# Altium footprint library PcbLib_ICs.PcbLib: 317 footprints (part 17 of 24)
Each footprint in its own frame and in the unit in brackets; x right, y up, seen from the top. Pads: shape width x height; smd on the part's side, far side on the other; paste and mask are expansions set on the pad; w line width, h text height; cw(c..) or ccw(c..) is an arc to the next point about the centre after c.
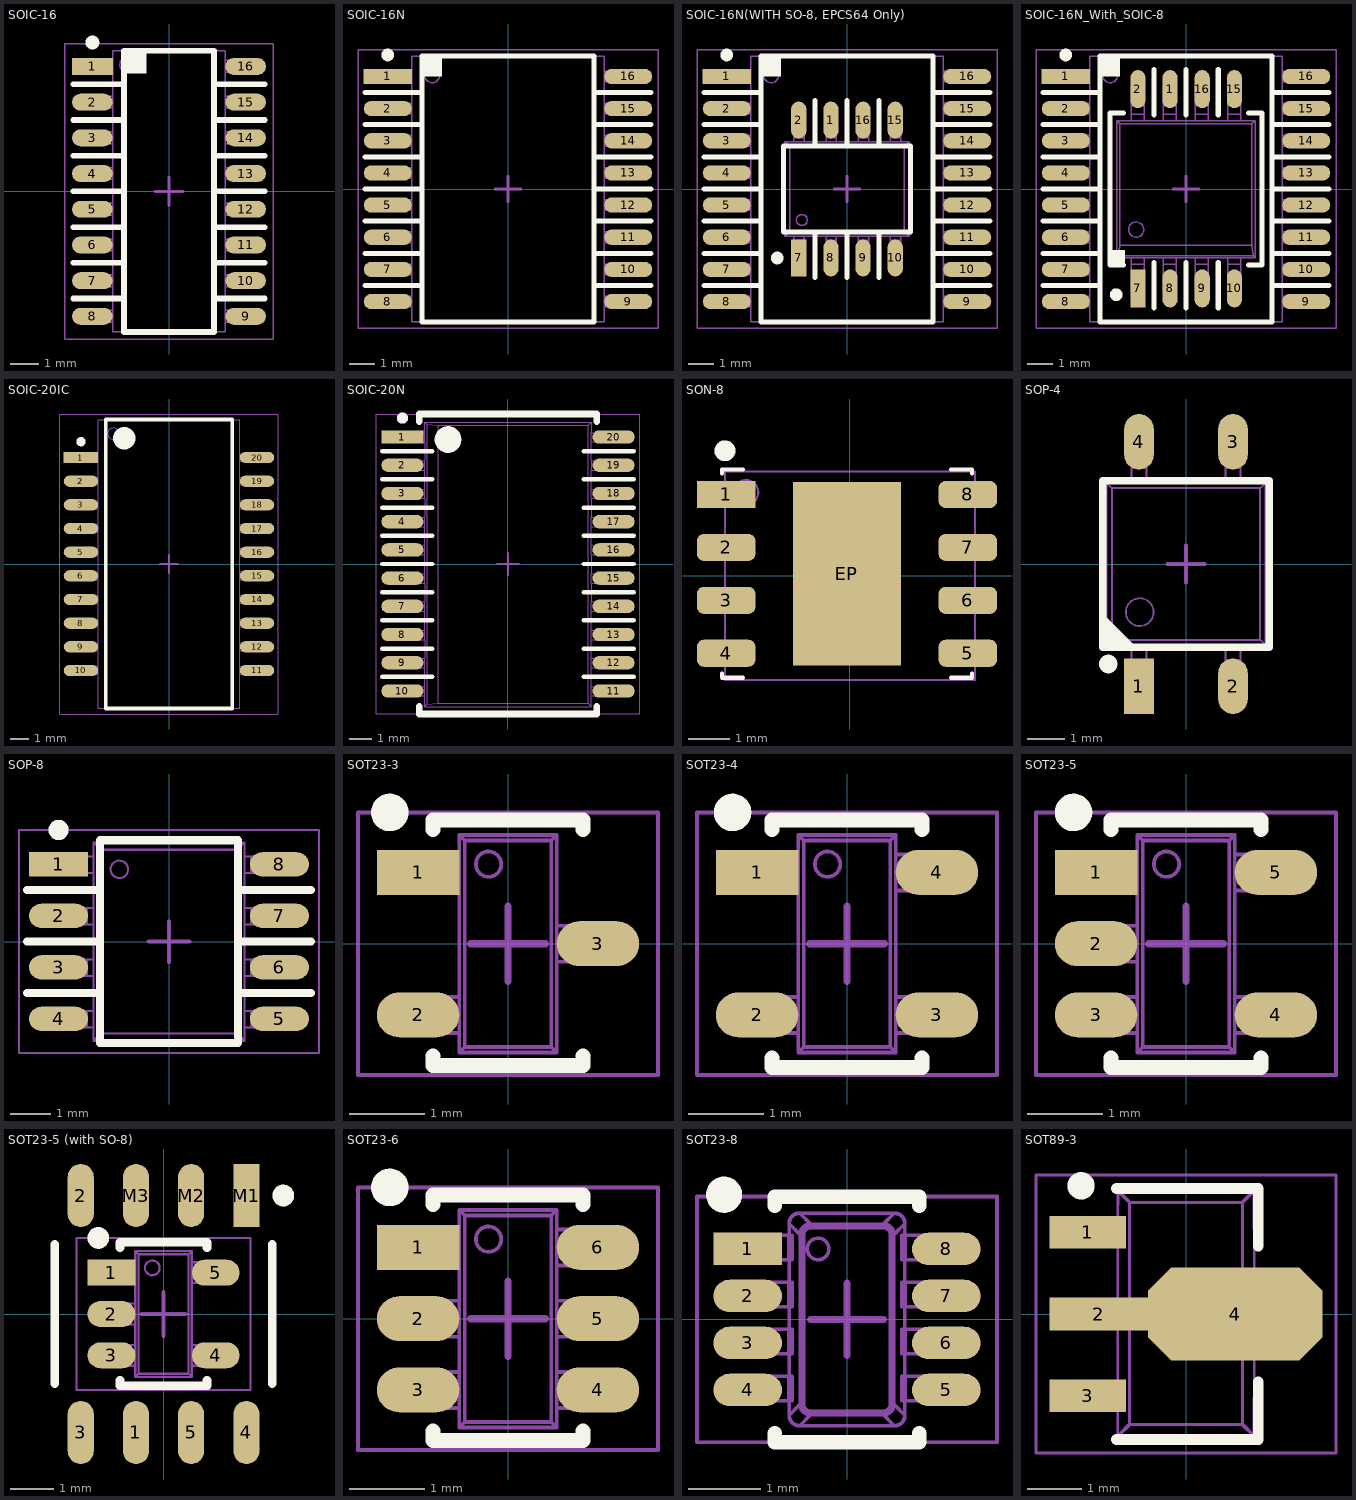
[diagram p16: the footprints below, top view; thin cyan lines are the x and y axes]

## SOIC-16 [mm] "package SOIC-16, 150 mil"
height 1.75
pads (16):
  rect 1.45x0.6 smd paste+0 mask+0.05: 1(-2.725,4.445)
  oval 1.45x0.6 smd paste+0 mask+0.05: 2(-2.725,3.175) 3(-2.725,1.905) 4(-2.725,0.635) 5(-2.725,-0.635) 6(-2.725,-1.905) 7(-2.725,-3.175) 8(-2.725,-4.445) 9(2.725,-4.445) 10(2.725,-3.175) 11(2.725,-1.905) 12(2.725,-0.635) 13(2.725,0.635) 14(2.725,1.905) 15(2.725,3.175) 16(2.725,4.445)
Top Overlay:
  circle w0.25: c-2.725,5.295 r0.125
  rectangle: -1.6,4.2 -0.8,5
  lines w0.2: -3.4,-3.81 -1.6,-3.81 ; -3.4,-2.54 -1.6,-2.54 ; -3.4,-1.27 -1.6,-1.27 ; -3.4,0 -1.6,0 ; -3.4,1.27 -1.6,1.27 ; -3.4,2.54 -1.6,2.54 ; -3.4,3.81 -1.6,3.81 ; 1.6,-3.81 3.4,-3.81 ; 1.6,-2.54 3.4,-2.54 ; 1.6,-1.27 3.4,-1.27 ; 1.6,0 3.4,0 ; 1.6,1.27 3.4,1.27 ; 1.6,2.54 3.4,2.54 ; 1.6,3.81 3.4,3.81 ; -1.6,-5 1.6,-5 1.6,5 -1.6,5 -1.6,-5
Top Assy:
  drawing of 213 lines, arcs and shapes, not listed
  text ".Designator" at 0.467,-3.443 h2
Top Text:
  lines w0.05: -3.7,-5.25 3.7,-5.25 3.7,5.25 -3.7,5.25 -3.7,-5.25
  lines w0.1: -0.5,0 0.5,0 ; 0,-0.5 0,0.5
3D body "SOIC-16.step": height 1.75, standoff 0, extent -3,-5 3,5

## SOIC-16N [mm] "SOIC16 300mil, 16-Leads, Body 10.29x7.49mm, Pitch 1.27mm, IPC Medium Density"
height 2.64
pads (16):
  rect 1.9x0.6 smd paste+0 mask+0.05: 1(-4.75,4.445)
  oval 1.9x0.6 smd paste+0 mask+0.05: 2(-4.75,3.175) 3(-4.75,1.905) 4(-4.75,0.635) 5(-4.75,-0.635) 6(-4.75,-1.905) 7(-4.75,-3.175) 8(-4.75,-4.445) 9(4.75,-4.445) 10(4.75,-3.175) 11(4.75,-1.905) 12(4.75,-0.635) 13(4.75,0.635) 14(4.75,1.905) 15(4.75,3.175) 16(4.75,4.445)
Top Overlay:
  circle w0.25: c-4.75,5.295 r0.125
  rectangle: -3.4,4.45 -2.6,5.25
  lines w0.2: -5.65,-3.81 -3.4,-3.81 ; -5.65,-2.54 -3.4,-2.54 ; -5.65,-1.27 -3.4,-1.27 ; -5.65,0 -3.4,0 ; -5.65,1.27 -3.4,1.27 ; -5.65,2.54 -3.4,2.54 ; -5.65,3.81 -3.4,3.81 ; 3.4,-3.81 5.65,-3.81 ; 3.4,-2.54 5.65,-2.54 ; 3.4,-1.27 5.65,-1.27 ; 3.4,0 5.65,0 ; 3.4,1.27 5.65,1.27 ; 3.4,2.54 5.65,2.54 ; 3.4,3.81 5.65,3.81 ; -3.4,-5.25 -3.4,5.25 3.4,5.25 3.4,-5.25 -3.4,-5.25
Top Assy:
  drawing of 213 lines, arcs and shapes, not listed
  text ".Designator" at 0.467,-3.443 h2
Top Text:
  lines w0.05: -5.925,-5.5 -5.925,5.5 5.925,5.5 5.925,-5.5 -5.925,-5.5
  lines w0.1: -0.5,0 0.5,0 ; 0,-0.5 0,0.5
3D body "SOIC-16N.step": height 2.64, standoff 0, extent -5.162,-5.25 5.163,5.25

## SOIC-16N(WITH SO-8, EPCS64 Only) [mm] "SOIC16 300mil, 16-Leads, Body 10.29x7.49mm, Pitch 1.27mm, IPC Medium Density"
height 2.64
pads (24):
  rect 1.9x0.6 smd paste+0 mask+0.05: 1(-4.75,4.445)
  oval 0.6x1.45 smd paste+0 mask+0.05: 1(-0.635,2.725) 2(-1.905,2.725) 8(-0.635,-2.725) 9(0.635,-2.725) 10(1.905,-2.725) 15(1.905,2.725) 16(0.635,2.725)
  oval 1.9x0.6 smd paste+0 mask+0.05: 2(-4.75,3.175) 3(-4.75,1.905) 4(-4.75,0.635) 5(-4.75,-0.635) 6(-4.75,-1.905) 7(-4.75,-3.175) 8(-4.75,-4.445) 9(4.75,-4.445) 10(4.75,-3.175) 11(4.75,-1.905) 12(4.75,-0.635) 13(4.75,0.635) 14(4.75,1.905) 15(4.75,3.175) 16(4.75,4.445)
  rect 0.6x1.45 smd paste+0 mask+0.05: 7(-1.905,-2.725)
Top Overlay:
  circle w0.25: c-4.75,5.295 r0.125
  circle w0.25: c-2.755,-2.725 r0.125
  rectangle: -3.4,4.45 -2.6,5.25
  lines w0.2: -5.65,-3.81 -3.4,-3.81 ; -5.65,-2.54 -3.4,-2.54 ; -5.65,-1.27 -3.4,-1.27 ; -5.65,0 -3.4,0 ; -5.65,1.27 -3.4,1.27 ; -5.65,2.54 -3.4,2.54 ; -5.65,3.81 -3.4,3.81 ; -1.27,-3.5 -1.27,-1.7 ; -1.27,1.7 -1.27,3.5 ; 0,-3.5 0,-1.7 ; 0,1.7 0,3.5 ; 1.27,-3.5 1.27,-1.7 ; 1.27,1.7 1.27,3.5 ; 3.4,-3.81 5.65,-3.81 ; 3.4,-2.54 5.65,-2.54 ; 3.4,-1.27 5.65,-1.27 ; 3.4,0 5.65,0 ; 3.4,1.27 5.65,1.27 ; 3.4,2.54 5.65,2.54 ; 3.4,3.81 5.65,3.81 ; -3.4,-5.25 3.4,-5.25 3.4,5.25 -3.4,5.25 -3.4,-5.25 ; -2.5,-1.7 -2.5,1.7 2.5,1.7 2.5,-1.7 -2.5,-1.7
Top Assy:
  drawing of 358 lines, arcs and shapes, not listed
  text ".Designator" at 0.467,-3.443 h2
Top Text:
  lines w0.05: -5.925,-5.5 5.925,-5.5 5.925,5.5 -5.925,5.5 -5.925,-5.5
  lines w0.1: -0.5,0 0.5,0 ; 0,-0.5 0,0.5
3D body "SOIC-16N.step": height 2.64, standoff 0, extent -5.162,-5.25 5.163,5.25

## SOIC-16N_With_SOIC-8 [mm] "SOIC16 300mil, 16-Leads, Body 10.29x7.49mm, Pitch 1.27mm, IPC Medium Density"
height 2.64
pads (24):
  rect 1.9x0.6 smd paste+0 mask+0.05: 1(-4.75,4.445)
  oval 0.6x1.5 smd paste+0 mask+0.05: 1(-0.63,3.943) 2(-1.9,3.943) 8(-0.63,-3.925) 9(0.64,-3.925) 10(1.91,-3.925) 15(1.91,3.943) 16(0.64,3.943)
  oval 1.9x0.6 smd paste+0 mask+0.05: 2(-4.75,3.175) 3(-4.75,1.905) 4(-4.75,0.635) 5(-4.75,-0.635) 6(-4.75,-1.905) 7(-4.75,-3.175) 8(-4.75,-4.445) 9(4.75,-4.445) 10(4.75,-3.175) 11(4.75,-1.905) 12(4.75,-0.635) 13(4.75,0.635) 14(4.75,1.905) 15(4.75,3.175) 16(4.75,4.445)
  rect 0.6x1.5 smd paste+0 mask+0.05: 7(-1.9,-3.925)
Top Overlay:
  circle w0.25: c-4.75,5.295 r0.125
  circle w0.25: c-2.755,-4.175 r0.125
  rectangle: -3.4,4.45 -2.6,5.25
  region: -2.4,-3 -2.4,-2.4 -3,-2.4 -3,-3
  lines w0.2: -5.65,-3.81 -3.4,-3.81 ; -5.65,-2.54 -3.4,-2.54 ; -5.65,-1.27 -3.4,-1.27 ; -5.65,0 -3.4,0 ; -5.65,1.27 -3.4,1.27 ; -5.65,2.54 -3.4,2.54 ; -5.65,3.81 -3.4,3.81 ; -2.475,-3 -3,-3 -3,3 -2.475,3 ; -1.265,-4.7 -1.265,-2.9 ; -1.265,2.918 -1.265,4.718 ; 0.005,-4.7 0.005,-2.9 ; 0.005,2.918 0.005,4.718 ; 1.275,-4.7 1.275,-2.9 ; 1.275,2.918 1.275,4.718 ; 2.475,-3 3,-3 3,3 2.475,3 ; 3.4,-3.81 5.65,-3.81 ; 3.4,-2.54 5.65,-2.54 ; 3.4,-1.27 5.65,-1.27 ; 3.4,0 5.65,0 ; 3.4,1.27 5.65,1.27 ; 3.4,2.54 5.65,2.54 ; 3.4,3.81 5.65,3.81 ; -3.4,-5.25 3.4,-5.25 3.4,5.25 -3.4,5.25 -3.4,-5.25
Top Assy:
  drawing of 365 lines, arcs and shapes, not listed
  text ".Designator" at 0.467,-3.443 h2
Top Text:
  lines w0.05: -5.925,-5.5 5.925,-5.5 5.925,5.5 -5.925,5.5 -5.925,-5.5
  lines w0.1: -0.5,0 0.5,0 -0.5,0 ; 0,-0.5 0,0.5 0,-0.5
3D body "SOIC-16N.step": height 2.64, standoff 0, extent -5.162,-5.25 5.163,5.25

## SOIC-20IC [mm] "SOIC, 20-Leads, Body 15,40x7,49mm, Pitch 1,27mm, IPC Medium Density"
height 2.64
pads (20):
  rect 1.85x0.6 smd paste+0 mask+0.05: 1(-4.725,5.715)
  oval 1.85x0.6 smd paste+0 mask+0.05: 2(-4.725,4.445) 3(-4.725,3.175) 4(-4.725,1.905) 5(-4.725,0.635) 6(-4.725,-0.635) 7(-4.725,-1.905) 8(-4.725,-3.175) 9(-4.725,-4.445) 10(-4.725,-5.715) 11(4.725,-5.715) 12(4.725,-4.445) 13(4.725,-3.175) 14(4.725,-1.905) 15(4.725,-0.635) 16(4.725,0.635) 17(4.725,1.905) 18(4.725,3.175) 19(4.725,4.445) 20(4.725,5.715)
Top Overlay:
  circle w0.6: c-2.4,6.75 r0.3
  circle w0.25: c-4.725,6.565 r0.125
  lines w0.2: -3.4,-7.75 3.4,-7.75 3.4,7.75 -3.4,7.75 -3.4,-7.75
Top Assy:
  drawing of 265 lines, arcs and shapes, not listed
  text ".Designator" at -3.443,-0.467 h2
Top Text:
  lines w0.05: -5.875,-8.05 5.875,-8.05 5.875,8.05 -5.875,8.05 -5.875,-8.05
  lines w0.1: -0.5,0 0.5,0 ; 0,-0.5 0,0.5
3D body "SOIC-20IC.step": height 2.64, standoff 0, extent -5.15,-7.75 5.15,7.75

## SOIC-20N [mm] "SOIC, 20-Leads, Body 12.80x7.50mm, Pitch 1.27mm, IPC Medium Density"
height 2.65
pads (20):
  rect 1.9x0.6 smd paste+0 mask+0.05: 1(-4.75,5.715)
  oval 1.9x0.6 smd paste+0 mask+0.05: 2(-4.75,4.445) 3(-4.75,3.175) 4(-4.75,1.905) 5(-4.75,0.635) 6(-4.75,-0.635) 7(-4.75,-1.905) 8(-4.75,-3.175) 9(-4.75,-4.445) 10(-4.75,-5.715) 11(4.75,-5.715) 12(4.75,-4.445) 13(4.75,-3.175) 14(4.75,-1.905) 15(4.75,-0.635) 16(4.75,0.635) 17(4.75,1.905) 18(4.75,3.175) 19(4.75,4.445) 20(4.75,5.715)
Top Overlay:
  circle w0.25: c-4.75,6.565 r0.125
  circle w0.6: c-2.7,5.6 r0.3
  lines w0.2: -5.65,-5.08 -3.4,-5.08 ; -5.65,-3.81 -3.4,-3.81 ; -5.65,-2.54 -3.4,-2.54 ; -5.65,-1.27 -3.4,-1.27 ; -5.65,0 -3.4,0 ; -5.65,1.27 -3.4,1.27 ; -5.65,2.54 -3.4,2.54 ; -5.65,3.81 -3.4,3.81 ; -5.65,5.08 -3.4,5.08 ; 3.4,-5.08 5.65,-5.08 ; 3.4,-3.81 5.65,-3.81 ; 3.4,-2.54 5.65,-2.54 ; 3.4,-1.27 5.65,-1.27 ; 3.4,0 5.65,0 ; 3.4,1.27 5.65,1.27 ; 3.4,2.54 5.65,2.54 ; 3.4,3.81 5.65,3.81 ; 3.4,5.08 5.65,5.08
  lines w0.3: -4,-6.4 -4,-6.75 4,-6.75 4,-6.4 ; -4,6.4 -4,6.75 4,6.75 4,6.4
Top Assy:
  drawing of 296 lines, arcs and shapes, not listed
  text ".Designator" at -3.443,-0.467 h2
Top Text:
  lines w0.05: -5.925,-6.75 -5.925,6.75 5.925,6.75 5.925,-6.75 -5.925,-6.75
  lines w0.1: -0.5,0 0.5,0 ; 0,-0.5 0,0.5
3D body "SOIC127P1030X265-20N.step": height 2.65, standoff 0, extent -5.162,-6.5 5.163,6.5

## SON-8 [mm] "SON-8, 8-Leads, Body 6,00x5,00mm, Pitch 1,27mm, Thermal Pad 4,1x2,4mm"
height 0.8
pads (9):
  rect 1.4x0.65 smd paste+0 mask+0.05: 1(-2.971,1.951)
  rrect50% 1.4x0.65 smd paste+0 mask+0.05: 2(-2.971,0.681) 3(-2.971,-0.589) 4(-2.971,-1.859) 5(2.829,-1.859) 6(2.829,-0.589) 7(2.829,0.681) 8(2.829,1.951)
  rect 2.6x4.4 smd paste-50 mask+0.05: EP(-0.071,0.051)
Top Overlay:
  circle w0.25: c-3,3 r0.125
  lines w0.1: -3.071,-2.349 -3.071,-2.449 -2.571,-2.449 ; -3.071,2.451 -3.071,2.551 -2.571,2.551 ; 2.429,-2.449 2.929,-2.449 2.929,-2.349 ; 2.429,2.551 2.929,2.551 2.929,2.451
Top Paste:
  rectangle: -1.371,1.751 -0.871,2.251
  rectangle: -1.371,1.151 -0.871,1.651
  rectangle: -1.371,0.551 -0.871,1.051
  rectangle: -1.371,-0.249 -0.871,0.451
  rectangle: -0.771,-0.249 -0.171,0.451
  rectangle: -0.771,0.551 -0.171,1.051
  rectangle: -0.771,1.151 -0.171,1.651
  rectangle: -0.771,1.751 -0.171,2.251
  rectangle: -0.071,-0.249 0.529,0.451
  rectangle: -0.071,0.551 0.529,1.051
  rectangle: -0.071,1.151 0.529,1.651
  rectangle: -0.071,1.751 0.529,2.251
  rectangle: 0.629,-0.249 1.229,0.451
  rectangle: 0.629,0.551 1.229,1.051
  rectangle: 0.629,1.151 1.229,1.651
  rectangle: 0.629,1.751 1.229,2.251
  rectangle: -1.371,-0.949 -0.871,-0.349
  rectangle: -1.371,-1.549 -0.871,-1.049
  rectangle: -1.371,-2.149 -0.871,-1.649
  rectangle: -0.771,-2.149 -0.171,-1.649
  rectangle: -0.771,-1.549 -0.171,-1.049
  rectangle: -0.771,-0.949 -0.171,-0.349
  rectangle: -0.071,-2.149 0.529,-1.649
  rectangle: -0.071,-1.549 0.529,-1.049
  rectangle: -0.071,-0.949 0.529,-0.349
  rectangle: 0.629,-2.149 1.229,-1.649
  rectangle: 0.629,-1.549 1.229,-1.049
  rectangle: 0.629,-0.949 1.229,-0.349
Top Solder:
  region: 1.329,2.351 -1.471,2.351 -1.471,-2.249 1.329,-2.249
Top Assy:
  circle w0.05: c-2.5,2 r0.3
  lines w0.05: -3,-2.13 -3.07,-2.13 -3.07,-1.59 -3,-1.59 ; -3,-0.86 -3.07,-0.86 -3.07,-0.32 -3,-0.32 ; -3,0.41 -3.07,0.41 -3.07,0.95 -3,0.95 ; -3,1.68 -3.07,1.68 -3.07,2.22 -3,2.22 ; 3,-2.13 3.07,-2.13 3.07,-1.59 3,-1.59 ; 3,-0.86 3.07,-0.86 3.07,-0.32 3,-0.32 ; 3,0.41 3.07,0.41 3.07,0.95 3,0.95 ; 3,1.68 3.07,1.68 3.07,2.22 3,2.22 ; -3,-2.5 0,-2.5 3,-2.5 3,2.5 0,2.5 -3,2.5 -3,-2.5
  text ".Designator" at 0.349,-2.579 h1.5
Top Text:
  lines w0.1: -0.5,0 0.5,0 ; 0,-0.5 0,0.5
3D body "User Library-TDFN-8.step": height 0.83, standoff 0, extent -3.571,-2.449 3.429,2.551

## SOP-4 [mm] "4-SOP (0.173\"\", 4.40mm)"
pads (4):
  rect 0.8x1.5 smd paste+0 mask+0.05: 1(-1.27,-3.3)
  oval 0.8x1.5 smd paste+0 mask+0.05: 2(1.27,-3.3) 3(1.27,3.3) 4(-1.27,3.3)
Top Overlay:
  circle w0.25: c-2.1,-2.7 r0.125
  region: -2.25,-2.25 -2.25,-1.35 -1.35,-2.25
  lines w0.2: -2.25,-2.25 2.25,-2.25 2.25,2.25 -2.25,2.25 -2.25,-2.25
Top Assy:
  circle w0.05: c-1.25,-1.3 r0.375
  lines w0.05: -2.15,-2.2 2.15,-2.2 ; -2.15,-2.2 -2.15,2.2 ; -2.15,-2.2 -2,-2.05 ; -2.15,2.2 2.15,2.2 ; -2.15,2.2 -2,2.05 ; -2,-2.05 2,-2.05 ; -2,-2.05 -2,2.05 ; -2,2.05 2,2.05 ; -1.47,-3.05 -1.07,-3.05 ; -1.47,-3.05 -1.47,-3.4 -1.07,-3.4 -1.07,-3.05 ; -1.47,-3.05 -1.47,-2.9 ; -1.47,-2.9 -1.47,-2.6 ; -1.47,-2.9 -1.07,-2.9 ; -1.47,-2.6 -1.07,-2.6 ; -1.47,-2.6 -1.47,-2.2 -1.07,-2.2 -1.07,-2.6 ; -1.47,2.6 -1.07,2.6 ; -1.47,2.6 -1.47,2.9 ; -1.47,2.6 -1.47,2.2 -1.07,2.2 -1.07,2.6 ; -1.47,2.9 -1.47,3.05 ; -1.47,2.9 -1.07,2.9 ; -1.47,3.05 -1.07,3.05 ; -1.47,3.05 -1.47,3.4 -1.07,3.4 -1.07,3.05 ; -1.07,-3.05 -1.07,-2.9 ; -1.07,-2.9 -1.07,-2.6 ; -1.07,2.6 -1.07,2.9 ; -1.07,2.9 -1.07,3.05 ; 1.07,-3.05 1.47,-3.05 ; 1.07,-3.05 1.07,-3.4 1.47,-3.4 1.47,-3.05 ; 1.07,-3.05 1.07,-2.9 ; 1.07,-2.9 1.07,-2.6 ; 1.07,-2.9 1.47,-2.9 ; 1.07,-2.6 1.47,-2.6 ; 1.07,-2.6 1.07,-2.2 1.47,-2.2 1.47,-2.6 ; 1.07,2.6 1.47,2.6 ; 1.07,2.6 1.07,2.9 ; 1.07,2.6 1.07,2.2 1.47,2.2 1.47,2.6 ; 1.07,2.9 1.07,3.05 ; 1.07,2.9 1.47,2.9 ; 1.07,3.05 1.47,3.05 ; 1.07,3.05 1.07,3.4 1.47,3.4 1.47,3.05 ; 1.47,-3.05 1.47,-2.9 ; 1.47,-2.9 1.47,-2.6 ; 1.47,2.6 1.47,2.9 ; 1.47,2.9 1.47,3.05 ; 2,-2.05 2.15,-2.2 ; 2,-2.05 2,2.05 ; 2,2.05 2.15,2.2 ; 2.15,-2.2 2.15,2.2
  text ".Designator" at -2.579,-0.349 h1.5
Top Text:
  lines w0.1: -0.5,0 0.5,0 ; 0,-0.5 0,0.5
3D body "User Library-4-SOP.STEP": height 2.1, standoff 0, extent -2.15,-3.4 2.15,3.4

## SOP-8 [mm] "SOP-8"
height 1.75
pads (8):
  rect 1.45x0.6 smd paste+0 mask+0.05: 1(-2.725,1.905)
  oval 1.45x0.6 smd paste+0 mask+0.05: 2(-2.725,0.635) 3(-2.725,-0.635) 4(-2.725,-1.905) 5(2.725,-1.905) 6(2.725,-0.635) 7(2.725,0.635) 8(2.725,1.905)
Top Overlay:
  circle w0.25: c-2.725,2.755 r0.125
  lines w0.2: -3.5,-1.27 -1.7,-1.27 ; -3.5,0 -1.7,0 ; -3.5,1.27 -1.7,1.27 ; 1.7,-1.27 3.5,-1.27 ; 1.7,0 3.5,0 ; 1.7,1.27 3.5,1.27 ; -1.7,-2.5 -1.7,2.5 1.7,2.5 1.7,-2.5 -1.7,-2.5
Top Assy:
  circle w0.05: c-1.225,1.784 r0.216
  lines w0.05: -2.889,-2.121 -2.502,-2.121 ; -2.889,-2.121 -2.889,-1.715 ; -2.889,-2.121 -2.889,-1.715 ; -2.889,-2.121 -1.867,-2.121 ; -2.889,-1.715 -2.502,-1.715 ; -2.889,-1.715 -1.867,-1.715 ; -2.889,-0.851 -2.502,-0.851 ; -2.889,-0.851 -2.889,-0.445 ; -2.889,-0.851 -2.889,-0.445 ; -2.889,-0.851 -1.867,-0.851 ; -2.889,-0.445 -2.502,-0.445 ; -2.889,-0.445 -1.867,-0.445 ; -2.889,0.419 -2.502,0.419 ; -2.889,0.419 -2.889,0.826 ; -2.889,0.419 -2.889,0.826 ; -2.889,0.419 -1.867,0.419 ; -2.889,0.826 -2.502,0.825 ; -2.889,0.826 -1.867,0.825 ; -2.889,1.689 -2.502,1.689 ; -2.889,1.689 -2.889,2.095 ; -2.889,1.689 -2.889,2.095 ; -2.889,1.689 -1.867,1.689 ; -2.889,2.095 -2.502,2.095 ; -2.889,2.095 -1.867,2.095 ; -2.502,-2.121 -2.502,-1.715 ; -2.502,-2.121 -2.261,-2.121 ; -2.502,-1.715 -2.261,-1.715 ; -2.502,-0.851 -2.502,-0.445 ; -2.502,-0.851 -2.261,-0.851 ; -2.502,-0.445 -2.261,-0.445 ; -2.502,0.419 -2.502,0.825 ; -2.502,0.419 -2.261,0.419 ; -2.502,0.825 -2.261,0.826 ; -2.502,1.689 -2.502,2.095 ; -2.502,1.689 -2.261,1.689 ; -2.502,2.095 -2.261,2.095 ; -2.261,-2.121 -2.261,-1.715 ; -2.261,-2.121 -2.019,-2.121 ; -2.261,-1.715 -2.019,-1.715 ; -2.261,-0.851 -2.261,-0.445 ; -2.261,-0.851 -2.019,-0.851 ; -2.261,-0.445 -2.019,-0.445 ; -2.261,0.419 -2.261,0.826 ; -2.261,0.419 -2.019,0.419 ; -2.261,0.826 -2.019,0.825 ; -2.261,1.689 -2.261,2.095 ; -2.261,1.689 -2.019,1.689 ; -2.261,2.095 -2.019,2.095 ; -2.019,-2.121 -2.019,-1.715 ; -2.019,-2.121 -1.867,-2.121 ; -2.019,-1.715 -1.867,-1.715 ; -2.019,-0.851 -2.019,-0.445 ; -2.019,-0.851 -1.867,-0.851 ; -2.019,-0.445 -1.867,-0.445 ; -2.019,0.419 -2.019,0.825 ; -2.019,0.419 -1.867,0.419 ; -2.019,0.825 -1.867,0.825 ; -2.019,1.689 -2.019,2.095 ; -2.019,1.689 -1.867,1.689 ; -2.019,2.095 -1.867,2.095 ; -1.867,-2.451 1.867,-2.451 ; -1.867,-2.451 -1.682,-2.266 ; -1.867,-2.451 -1.867,2.451 ; -1.867,-2.451 -1.867,-2.121 ; -1.867,-2.451 1.867,-2.451 ; -1.867,-1.715 -1.867,-0.851 ; -1.867,-0.445 -1.867,0.419 ; -1.867,0.825 -1.867,1.689 ; -1.867,2.095 -1.867,2.451 ; -1.867,2.451 1.867,2.451 ; -1.867,2.451 -1.682,2.266 ; -1.867,2.451 1.867,2.451 ; -1.682,-2.266 1.682,-2.266 ; -1.682,-2.266 -1.682,2.266 ; -1.682,2.266 1.682,2.266 ; 1.682,-2.266 1.867,-2.451 ; 1.682,-2.266 1.682,2.266 ; 1.682,2.266 1.867,2.451 ; 1.867,-2.451 1.867,2.451 ; 1.867,-2.451 1.867,-2.121 ; 1.867,-2.121 2.019,-2.121 ; 1.867,-2.121 2.889,-2.121 ; 1.867,-1.715 2.019,-1.715 ; 1.867,-1.715 2.889,-1.715 ; 1.867,-1.715 1.867,-0.851 ; 1.867,-0.851 2.019,-0.851 ; 1.867,-0.851 2.889,-0.851 ; 1.867,-0.445 2.019,-0.445 ; 1.867,-0.445 2.889,-0.445 ; 1.867,-0.445 1.867,0.419 ; 1.867,0.419 2.019,0.419 ; 1.867,0.419 2.889,0.419 ; 1.867,0.825 2.019,0.826 ; 1.867,0.825 2.889,0.825 ; 1.867,0.825 1.867,1.689 ; 1.867,1.689 2.019,1.689 ; 1.867,1.689 2.889,1.689 ; 1.867,2.095 2.019,2.095 ; 1.867,2.095 2.889,2.095 ; 1.867,2.095 1.867,2.451 ; 2.019,-2.121 2.019,-1.715 ; 2.019,-2.121 2.261,-2.121 ; 2.019,-1.715 2.261,-1.715 ; 2.019,-0.851 2.019,-0.445 ; 2.019,-0.851 2.261,-0.851 ; 2.019,-0.445 2.261,-0.445 ; 2.019,0.419 2.019,0.826 ; 2.019,0.419 2.261,0.419 ; 2.019,0.826 2.261,0.826 ; 2.019,1.689 2.019,2.095 ; 2.019,1.689 2.261,1.689 ; 2.019,2.095 2.261,2.095 ; 2.261,-2.121 2.502,-2.121 ; 2.261,-2.121 2.261,-1.715 ; 2.261,-1.715 2.502,-1.715 ; 2.261,-0.851 2.502,-0.851 ; 2.261,-0.851 2.261,-0.445 ; 2.261,-0.445 2.502,-0.445 ; 2.261,0.419 2.502,0.419 ; 2.261,0.419 2.261,0.826 ; 2.261,0.826 2.502,0.825 ; 2.261,1.689 2.502,1.689 ; 2.261,1.689 2.261,2.095 ; 2.261,2.095 2.502,2.095 ; 2.502,-2.121 2.502,-1.715 ; 2.502,-2.121 2.889,-2.121 ; 2.502,-1.715 2.889,-1.715 ; 2.502,-0.851 2.502,-0.445 ; 2.502,-0.851 2.889,-0.851 ; 2.502,-0.445 2.889,-0.445 ; 2.502,0.419 2.502,0.825 ; 2.502,0.419 2.889,0.419 ; 2.502,0.825 2.889,0.825 ; 2.502,1.689 2.502,2.095 ; 2.502,1.689 2.889,1.689 ; 2.502,2.095 2.889,2.095 ; 2.889,-2.121 2.889,-1.715 ; 2.889,-2.121 2.889,-1.715 ; 2.889,-0.851 2.889,-0.445 ; 2.889,-0.851 2.889,-0.445 ; 2.889,0.419 2.889,0.825 ; 2.889,0.419 2.889,0.825 ; 2.889,1.689 2.889,2.095 ; 2.889,1.689 2.889,2.095
  text ".Designator" at 0.467,-3.443 h2
Top Text:
  lines w0.05: -3.7,-2.75 3.7,-2.75 3.7,2.75 -3.7,2.75 -3.7,-2.75
  lines w0.1: -0.5,0 0.5,0 ; 0,-0.5 0,0.5
3D body "User Library-SOIC-8-1.step": height 1.75, standoff 0, extent -3,-2.45 3,2.45

## SOT23-3 [mm] "SOT23, 6-Leads, Body 2.90x2.80mm, Pitch 0.95mm, IPC Medium Density"
height 1.45
pads (3):
  rect 1.1x0.6 smd paste+0 mask+0.05: 1(-1.2,0.95)
  oval 1.1x0.6 smd paste+0 mask+0.05: 2(-1.2,-0.95) 3(1.2,0)
Top Overlay:
  circle w0.25: c-1.575,1.75 r0.125
  lines w0.2: -1,-1.5 -1,-1.625 1,-1.625 1,-1.5 ; -1,1.525 -1,1.65 1,1.65 1,1.525
Top Assy:
  circle w0.05: c-0.26,1.06 r0.169
  lines w0.05: -1.19,-1.19 -1.099,-1.19 ; -1.19,-1.19 -1.4,-1.19 -1.4,-0.71 -1.19,-0.71 ; -1.19,-1.19 -1.19,-0.71 ; -1.19,-0.71 -1.099,-0.71 ; -1.19,0.71 -1.099,0.71 ; -1.19,0.71 -1.4,0.71 -1.4,1.19 -1.19,1.19 ; -1.19,0.71 -1.19,1.19 ; -1.19,1.19 -1.099,1.19 ; -1.099,-1.19 -1.074,-1.19 ; -1.099,-1.19 -1.099,-0.71 ; -1.099,-0.71 -1.074,-0.71 ; -1.099,0.71 -1.074,0.71 ; -1.099,0.71 -1.099,1.19 ; -1.099,1.19 -1.074,1.19 ; -1.074,-1.19 -0.825,-1.19 ; -1.074,-1.19 -1.074,-0.71 ; -1.074,-0.71 -0.825,-0.71 ; -1.074,0.71 -0.825,0.71 ; -1.074,0.71 -1.074,1.19 ; -1.074,1.19 -0.825,1.19 ; -0.825,-1.19 -0.65,-1.19 ; -0.825,-1.19 -0.825,-0.71 ; -0.825,-0.71 -0.65,-0.71 ; -0.825,0.71 -0.65,0.71 ; -0.825,0.71 -0.825,1.19 ; -0.825,1.19 -0.65,1.19 ; -0.65,-1.45 -0.576,-1.376 ; -0.65,-1.45 -0.65,-1.19 ; -0.65,-1.45 0.65,-1.45 ; -0.65,-1.19 -0.65,-0.71 ; -0.65,-0.71 -0.65,0.71 ; -0.65,0.71 -0.65,1.19 ; -0.65,1.19 -0.65,1.45 ; -0.65,1.45 0.65,1.45 ; -0.65,1.45 -0.576,1.376 ; -0.576,-1.376 -0.576,1.376 ; -0.576,-1.376 0.576,-1.376 ; -0.576,1.376 0.576,1.376 ; 0.576,-1.376 0.576,1.376 ; 0.576,-1.376 0.65,-1.45 ; 0.576,1.376 0.65,1.45 ; 0.65,-1.45 0.65,-0.24 ; 0.65,-0.24 0.65,0.24 ; 0.65,-0.24 0.825,-0.24 ; 0.65,0.24 0.65,1.45 ; 0.65,0.24 0.825,0.24 ; 0.825,-0.24 1.074,-0.24 ; 0.825,-0.24 0.825,0.24 ; 0.825,0.24 1.074,0.24 ; 1.074,-0.24 1.099,-0.24 ; 1.074,-0.24 1.074,0.24 ; 1.074,0.24 1.099,0.24 ; 1.099,-0.24 1.19,-0.24 ; 1.099,-0.24 1.099,0.24 ; 1.099,0.24 1.19,0.24 ; 1.19,-0.24 1.4,-0.24 1.4,0.24 1.19,0.24 ; 1.19,-0.24 1.19,0.24
  text ".Designator" at 0.233,-1.719 h1
Top Text:
  lines w0.05: -2,-1.75 -2,1.75 2,1.75 2,-1.75 -2,-1.75
  lines w0.1: -0.5,0 0.5,0 ; 0,-0.5 0,0.5
3D body "SC-74-3.stp": height 1.14, standoff 0.04, extent -1.3,-1.45 1.3,1.45

## SOT23-4 [mm] "SOT23, 6-Leads, Body 2.90x2.80mm, Pitch 0.95mm, IPC Medium Density"
height 1.45
pads (4):
  rect 1.1x0.6 smd paste+0 mask+0.05: 1(-1.2,0.95)
  oval 1.1x0.6 smd paste+0 mask+0.05: 2(-1.2,-0.95) 3(1.2,-0.95) 4(1.2,0.95)
Top Overlay:
  circle w0.25: c-1.525,1.75 r0.125
  lines w0.2: -1,-1.525 -1,-1.65 1,-1.65 1,-1.525 ; -1,1.525 -1,1.65 1,1.65 1,1.525
Top Assy:
  circle w0.05: c-0.26,1.06 r0.169
  lines w0.05: -1.19,-1.19 -1.099,-1.19 ; -1.19,-1.19 -1.4,-1.19 -1.4,-0.71 -1.19,-0.71 ; -1.19,-1.19 -1.19,-0.71 ; -1.19,-0.71 -1.099,-0.71 ; -1.19,0.71 -1.099,0.71 ; -1.19,0.71 -1.4,0.71 -1.4,1.19 -1.19,1.19 ; -1.19,0.71 -1.19,1.19 ; -1.19,1.19 -1.099,1.19 ; -1.099,-1.19 -1.074,-1.19 ; -1.099,-1.19 -1.099,-0.71 ; -1.099,-0.71 -1.074,-0.71 ; -1.099,0.71 -1.074,0.71 ; -1.099,0.71 -1.099,1.19 ; -1.099,1.19 -1.074,1.19 ; -1.074,-1.19 -0.825,-1.19 ; -1.074,-1.19 -1.074,-0.71 ; -1.074,-0.71 -0.825,-0.71 ; -1.074,0.71 -0.825,0.71 ; -1.074,0.71 -1.074,1.19 ; -1.074,1.19 -0.825,1.19 ; -0.825,-1.19 -0.65,-1.19 ; -0.825,-1.19 -0.825,-0.71 ; -0.825,-0.71 -0.65,-0.71 ; -0.825,0.71 -0.65,0.71 ; -0.825,0.71 -0.825,1.19 ; -0.825,1.19 -0.65,1.19 ; -0.65,-1.45 -0.576,-1.376 ; -0.65,-1.45 -0.65,-1.19 ; -0.65,-1.45 0.65,-1.45 ; -0.65,-1.19 -0.65,-0.71 ; -0.65,-0.71 -0.65,0.71 ; -0.65,0.71 -0.65,1.19 ; -0.65,1.19 -0.65,1.45 ; -0.65,1.45 0.65,1.45 ; -0.65,1.45 -0.576,1.376 ; -0.576,-1.376 -0.576,1.376 ; -0.576,-1.376 0.576,-1.376 ; -0.576,1.376 0.576,1.376 ; 0.576,-1.376 0.576,1.376 ; 0.576,-1.376 0.65,-1.45 ; 0.576,1.376 0.65,1.45 ; 0.65,-1.45 0.65,-0.24 0.65,0.24 0.65,1.45 ; 0.825,-1.19 0.825,-0.71 ; 0.825,-1.19 0.65,-1.19 0.65,-0.71 0.825,-0.71 ; 0.825,-1.19 1.074,-1.19 ; 0.825,-0.71 1.074,-0.71 ; 0.825,0.71 0.825,1.19 ; 0.825,0.71 1.074,0.71 ; 0.825,0.71 0.65,0.71 0.65,1.19 0.825,1.19 ; 0.825,1.19 1.074,1.19 ; 1.074,-1.19 1.074,-0.71 ; 1.074,-1.19 1.099,-1.19 ; 1.074,-0.71 1.099,-0.71 ; 1.074,0.71 1.074,1.19 ; 1.074,0.71 1.099,0.71 ; 1.074,1.19 1.099,1.19 ; 1.099,-1.19 1.099,-0.71 ; 1.099,-1.19 1.19,-1.19 ; 1.099,-0.71 1.19,-0.71 ; 1.099,0.71 1.099,1.19 ; 1.099,0.71 1.19,0.71 ; 1.099,1.19 1.19,1.19 ; 1.19,-1.19 1.19,-0.71 ; 1.19,-1.19 1.4,-1.19 1.4,-0.71 1.19,-0.71 ; 1.19,0.71 1.19,1.19 ; 1.19,0.71 1.4,0.71 1.4,1.19 1.19,1.19
  text ".Designator" at 0.233,-1.719 h1
Top Text:
  lines w0.05: -2,-1.75 -2,1.75 2,1.75 2,-1.75 -2,-1.75
  lines w0.1: -0.5,0 0.5,0 ; 0,-0.5 0,0.5
3D body "SC-74-4.stp": height 1.14, standoff 0.04, extent -1.3,-1.45 1.3,1.45

## SOT23-5 [mm] "SOT23, 6-Leads, Body 2.90x2.80mm, Pitch 0.95mm, IPC Medium Density"
height 1.45
pads (5):
  rect 1.1x0.6 smd paste+0 mask+0.05: 1(-1.2,0.95)
  oval 1.1x0.6 smd paste+0 mask+0.05: 2(-1.2,0) 3(-1.2,-0.95) 4(1.2,-0.95) 5(1.2,0.95)
Top Overlay:
  circle w0.25: c-1.5,1.75 r0.125
  lines w0.2: -1,-1.525 -1,-1.65 1,-1.65 1,-1.525 ; -1,1.525 -1,1.65 1,1.65 1,1.525
Top Assy:
  circle w0.05: c-0.26,1.06 r0.169
  lines w0.05: -0.65,-0.24 -0.825,-0.24 ; -0.65,0.24 -0.825,0.24 ; 0.65,-1.19 0.825,-1.19 ; 0.65,-0.71 0.825,-0.71 ; 0.65,0.71 0.825,0.71 ; 0.65,1.19 0.825,1.19 ; -1.19,-1.19 -1.099,-1.19 ; -1.19,-1.19 -1.4,-1.19 -1.4,-0.71 -1.19,-0.71 ; -1.19,-1.19 -1.19,-0.71 ; -1.19,-0.71 -1.099,-0.71 ; -1.19,-0.24 -1.19,0.24 ; -1.19,-0.24 -1.4,-0.24 -1.4,0.24 -1.19,0.24 ; -1.19,-0.24 -1.099,-0.24 ; -1.19,0.24 -1.099,0.24 ; -1.19,0.71 -1.099,0.71 ; -1.19,0.71 -1.4,0.71 -1.4,1.19 -1.19,1.19 ; -1.19,0.71 -1.19,1.19 ; -1.19,1.19 -1.099,1.19 ; -1.099,-1.19 -1.074,-1.19 ; -1.099,-1.19 -1.099,-0.71 ; -1.099,-0.71 -1.074,-0.71 ; -1.099,-0.24 -1.099,0.24 ; -1.099,-0.24 -1.074,-0.24 ; -1.099,0.24 -1.074,0.24 ; -1.099,0.71 -1.074,0.71 ; -1.099,0.71 -1.099,1.19 ; -1.099,1.19 -1.074,1.19 ; -1.074,-1.19 -0.825,-1.19 ; -1.074,-1.19 -1.074,-0.71 ; -1.074,-0.71 -0.825,-0.71 ; -1.074,-0.24 -1.074,0.24 ; -1.074,-0.24 -0.825,-0.24 ; -1.074,0.24 -0.825,0.24 ; -1.074,0.71 -0.825,0.71 ; -1.074,0.71 -1.074,1.19 ; -1.074,1.19 -0.825,1.19 ; -0.825,-1.19 -0.65,-1.19 ; -0.825,-1.19 -0.825,-0.71 ; -0.825,-0.71 -0.65,-0.71 ; -0.825,-0.24 -0.825,0.24 ; -0.825,0.71 -0.65,0.71 ; -0.825,0.71 -0.825,1.19 ; -0.825,1.19 -0.65,1.19 ; -0.65,-1.45 -0.576,-1.376 ; -0.65,-1.45 -0.65,-1.19 ; -0.65,-1.45 0.65,-1.45 ; -0.65,-1.19 -0.65,-0.71 ; -0.65,-0.71 -0.65,0.71 ; -0.65,0.71 -0.65,1.19 ; -0.65,1.19 -0.65,1.45 ; -0.65,1.45 0.65,1.45 ; -0.65,1.45 -0.576,1.376 ; -0.576,-1.376 -0.576,1.376 ; -0.576,-1.376 0.576,-1.376 ; -0.576,1.376 0.576,1.376 ; 0.576,-1.376 0.576,1.376 ; 0.576,-1.376 0.65,-1.45 ; 0.576,1.376 0.65,1.45 ; 0.65,-1.45 0.65,-0.24 0.65,0.24 0.65,1.45 ; 0.825,-1.19 0.825,-0.71 ; 0.825,-1.19 1.074,-1.19 ; 0.825,-0.71 1.074,-0.71 ; 0.825,0.71 0.825,1.19 ; 0.825,0.71 1.074,0.71 ; 0.825,1.19 1.074,1.19 ; 1.074,-1.19 1.074,-0.71 ; 1.074,-1.19 1.099,-1.19 ; 1.074,-0.71 1.099,-0.71 ; 1.074,0.71 1.074,1.19 ; 1.074,0.71 1.099,0.71 ; 1.074,1.19 1.099,1.19 ; 1.099,-1.19 1.099,-0.71 ; 1.099,-1.19 1.19,-1.19 ; 1.099,-0.71 1.19,-0.71 ; 1.099,0.71 1.099,1.19 ; 1.099,0.71 1.19,0.71 ; 1.099,1.19 1.19,1.19 ; 1.19,-1.19 1.19,-0.71 ; 1.19,-1.19 1.4,-1.19 1.4,-0.71 1.19,-0.71 ; 1.19,0.71 1.19,1.19 ; 1.19,0.71 1.4,0.71 1.4,1.19 1.19,1.19
  text ".Designator" at 0.233,-1.719 h1
Top Text:
  lines w0.05: -2,-1.75 -2,1.75 2,1.75 2,-1.75 -2,-1.75
  lines w0.1: -0.5,0 0.5,0 ; 0,-0.5 0,0.5
3D body "SC-74-5.stp": height 1.14, standoff 0.04, extent -1.3,-1.45 1.3,1.45

## SOT23-5 (with SO-8) [mm] "SOT23, 6-Leads, Body 2.90x2.80mm, Pitch 0.95mm, IPC Medium Density"
height 1.45
pads (13):
  rect 1.1x0.6 smd paste+0 mask+0.05: 1(-1.2,0.95)
  oval 0.6x1.45 smd paste+0 mask+0.05: 1(-0.635,-2.725) 2(-1.905,2.725) 3(-1.905,-2.725) 4(1.905,-2.725) 5(0.635,-2.725) M2(0.635,2.725) M3(-0.635,2.725)
  oval 1.1x0.6 smd paste+0 mask+0.05: 2(-1.2,0) 3(-1.2,-0.95) 4(1.2,-0.95) 5(1.2,0.95)
  rect 0.6x1.45 smd paste+0 mask+0.05: M1(1.905,2.725)
Top Overlay:
  circle w0.25: c2.755,2.725 r0.125
  circle w0.25: c-1.5,1.75 r0.125
  lines w0.2: -2.5,-1.6 -2.5,1.6 ; -1,-1.525 -1,-1.65 1,-1.65 1,-1.525 ; -1,1.525 -1,1.65 1,1.65 1,1.525 ; 2.5,-1.6 2.5,1.6
Top Assy:
  circle w0.05: c-0.26,1.06 r0.169
  lines w0.05: -0.65,-0.24 -0.825,-0.24 ; -0.65,0.24 -0.825,0.24 ; 0.65,-1.19 0.825,-1.19 ; 0.65,-0.71 0.825,-0.71 ; 0.65,0.71 0.825,0.71 ; 0.65,1.19 0.825,1.19 ; -1.19,-1.19 -1.099,-1.19 ; -1.19,-1.19 -1.4,-1.19 -1.4,-0.71 -1.19,-0.71 ; -1.19,-1.19 -1.19,-0.71 ; -1.19,-0.71 -1.099,-0.71 ; -1.19,-0.24 -1.19,0.24 ; -1.19,-0.24 -1.4,-0.24 -1.4,0.24 -1.19,0.24 ; -1.19,-0.24 -1.099,-0.24 ; -1.19,0.24 -1.099,0.24 ; -1.19,0.71 -1.099,0.71 ; -1.19,0.71 -1.4,0.71 -1.4,1.19 -1.19,1.19 ; -1.19,0.71 -1.19,1.19 ; -1.19,1.19 -1.099,1.19 ; -1.099,-1.19 -1.074,-1.19 ; -1.099,-1.19 -1.099,-0.71 ; -1.099,-0.71 -1.074,-0.71 ; -1.099,-0.24 -1.099,0.24 ; -1.099,-0.24 -1.074,-0.24 ; -1.099,0.24 -1.074,0.24 ; -1.099,0.71 -1.074,0.71 ; -1.099,0.71 -1.099,1.19 ; -1.099,1.19 -1.074,1.19 ; -1.074,-1.19 -0.825,-1.19 ; -1.074,-1.19 -1.074,-0.71 ; -1.074,-0.71 -0.825,-0.71 ; -1.074,-0.24 -1.074,0.24 ; -1.074,-0.24 -0.825,-0.24 ; -1.074,0.24 -0.825,0.24 ; -1.074,0.71 -0.825,0.71 ; -1.074,0.71 -1.074,1.19 ; -1.074,1.19 -0.825,1.19 ; -0.825,-1.19 -0.65,-1.19 ; -0.825,-1.19 -0.825,-0.71 ; -0.825,-0.71 -0.65,-0.71 ; -0.825,-0.24 -0.825,0.24 ; -0.825,0.71 -0.65,0.71 ; -0.825,0.71 -0.825,1.19 ; -0.825,1.19 -0.65,1.19 ; -0.65,-1.45 -0.576,-1.376 ; -0.65,-1.45 -0.65,-1.19 ; -0.65,-1.45 0.65,-1.45 ; -0.65,-1.19 -0.65,-0.71 ; -0.65,-0.71 -0.65,0.71 ; -0.65,0.71 -0.65,1.19 ; -0.65,1.19 -0.65,1.45 ; -0.65,1.45 0.65,1.45 ; -0.65,1.45 -0.576,1.376 ; -0.576,-1.376 -0.576,1.376 ; -0.576,-1.376 0.576,-1.376 ; -0.576,1.376 0.576,1.376 ; 0.576,-1.376 0.576,1.376 ; 0.576,-1.376 0.65,-1.45 ; 0.576,1.376 0.65,1.45 ; 0.65,-1.45 0.65,-0.24 0.65,0.24 0.65,1.45 ; 0.825,-1.19 0.825,-0.71 ; 0.825,-1.19 1.074,-1.19 ; 0.825,-0.71 1.074,-0.71 ; 0.825,0.71 0.825,1.19 ; 0.825,0.71 1.074,0.71 ; 0.825,1.19 1.074,1.19 ; 1.074,-1.19 1.074,-0.71 ; 1.074,-1.19 1.099,-1.19 ; 1.074,-0.71 1.099,-0.71 ; 1.074,0.71 1.074,1.19 ; 1.074,0.71 1.099,0.71 ; 1.074,1.19 1.099,1.19 ; 1.099,-1.19 1.099,-0.71 ; 1.099,-1.19 1.19,-1.19 ; 1.099,-0.71 1.19,-0.71 ; 1.099,0.71 1.099,1.19 ; 1.099,0.71 1.19,0.71 ; 1.099,1.19 1.19,1.19 ; 1.19,-1.19 1.19,-0.71 ; 1.19,-1.19 1.4,-1.19 1.4,-0.71 1.19,-0.71 ; 1.19,0.71 1.19,1.19 ; 1.19,0.71 1.4,0.71 1.4,1.19 1.19,1.19
  text ".Designator" at 0.233,-1.719 h1
Top Text:
  lines w0.05: -2,-1.75 -2,1.75 2,1.75 2,-1.75 -2,-1.75
  lines w0.1: -0.5,0 0.5,0 ; 0,-0.5 0,0.5
3D body "SC-74-5.stp": height 1.14, standoff 0.04, extent -1.3,-1.45 1.3,1.45

## SOT23-6 [mm] "SOT23, 6-Leads, Body 2.90x2.80mm, Pitch 0.95mm, IPC Medium Density"
height 1.45
pads (6):
  rect 1.1x0.6 smd paste+0 mask+0.05: 1(-1.2,0.95)
  oval 1.1x0.6 smd paste+0 mask+0.05: 2(-1.2,0) 3(-1.2,-0.95) 4(1.2,-0.95) 5(1.2,0) 6(1.2,0.95)
Top Overlay:
  circle w0.25: c-1.575,1.75 r0.125
  lines w0.2: -1,-1.5 -1,-1.625 1,-1.625 1,-1.5 ; -1,1.525 -1,1.65 1,1.65 1,1.525
Top Assy:
  circle w0.05: c-0.26,1.06 r0.169
  lines w0.05: -0.65,-0.24 -0.825,-0.24 ; -0.65,0.24 -0.825,0.24 ; 0.65,-1.19 0.825,-1.19 ; 0.65,-0.71 0.825,-0.71 ; 0.65,0.71 0.825,0.71 ; 0.65,1.19 0.825,1.19 ; -1.19,-1.19 -1.099,-1.19 ; -1.19,-1.19 -1.4,-1.19 -1.4,-0.71 -1.19,-0.71 ; -1.19,-1.19 -1.19,-0.71 ; -1.19,-0.71 -1.099,-0.71 ; -1.19,-0.24 -1.19,0.24 ; -1.19,-0.24 -1.4,-0.24 -1.4,0.24 -1.19,0.24 ; -1.19,-0.24 -1.099,-0.24 ; -1.19,0.24 -1.099,0.24 ; -1.19,0.71 -1.099,0.71 ; -1.19,0.71 -1.4,0.71 -1.4,1.19 -1.19,1.19 ; -1.19,0.71 -1.19,1.19 ; -1.19,1.19 -1.099,1.19 ; -1.099,-1.19 -1.074,-1.19 ; -1.099,-1.19 -1.099,-0.71 ; -1.099,-0.71 -1.074,-0.71 ; -1.099,-0.24 -1.099,0.24 ; -1.099,-0.24 -1.074,-0.24 ; -1.099,0.24 -1.074,0.24 ; -1.099,0.71 -1.074,0.71 ; -1.099,0.71 -1.099,1.19 ; -1.099,1.19 -1.074,1.19 ; -1.074,-1.19 -0.825,-1.19 ; -1.074,-1.19 -1.074,-0.71 ; -1.074,-0.71 -0.825,-0.71 ; -1.074,-0.24 -1.074,0.24 ; -1.074,-0.24 -0.825,-0.24 ; -1.074,0.24 -0.825,0.24 ; -1.074,0.71 -0.825,0.71 ; -1.074,0.71 -1.074,1.19 ; -1.074,1.19 -0.825,1.19 ; -0.825,-1.19 -0.65,-1.19 ; -0.825,-1.19 -0.825,-0.71 ; -0.825,-0.71 -0.65,-0.71 ; -0.825,-0.24 -0.825,0.24 ; -0.825,0.71 -0.65,0.71 ; -0.825,0.71 -0.825,1.19 ; -0.825,1.19 -0.65,1.19 ; -0.65,-1.45 -0.576,-1.376 ; -0.65,-1.45 -0.65,-1.19 ; -0.65,-1.45 0.65,-1.45 ; -0.65,-1.19 -0.65,-0.71 ; -0.65,-0.71 -0.65,0.71 ; -0.65,0.71 -0.65,1.19 ; -0.65,1.19 -0.65,1.45 ; -0.65,1.45 0.65,1.45 ; -0.65,1.45 -0.576,1.376 ; -0.576,-1.376 -0.576,1.376 ; -0.576,-1.376 0.576,-1.376 ; -0.576,1.376 0.576,1.376 ; 0.576,-1.376 0.576,1.376 ; 0.576,-1.376 0.65,-1.45 ; 0.576,1.376 0.65,1.45 ; 0.65,-1.45 0.65,-0.24 ; 0.65,-0.24 0.65,0.24 ; 0.65,-0.24 0.825,-0.24 ; 0.65,0.24 0.65,1.45 ; 0.65,0.24 0.825,0.24 ; 0.825,-1.19 0.825,-0.71 ; 0.825,-1.19 1.074,-1.19 ; 0.825,-0.71 1.074,-0.71 ; 0.825,-0.24 1.074,-0.24 ; 0.825,-0.24 0.825,0.24 ; 0.825,0.24 1.074,0.24 ; 0.825,0.71 0.825,1.19 ; 0.825,0.71 1.074,0.71 ; 0.825,1.19 1.074,1.19 ; 1.074,-1.19 1.074,-0.71 ; 1.074,-1.19 1.099,-1.19 ; 1.074,-0.71 1.099,-0.71 ; 1.074,-0.24 1.099,-0.24 ; 1.074,-0.24 1.074,0.24 ; 1.074,0.24 1.099,0.24 ; 1.074,0.71 1.074,1.19 ; 1.074,0.71 1.099,0.71 ; 1.074,1.19 1.099,1.19 ; 1.099,-1.19 1.099,-0.71 ; 1.099,-1.19 1.19,-1.19 ; 1.099,-0.71 1.19,-0.71 ; 1.099,-0.24 1.19,-0.24 ; 1.099,-0.24 1.099,0.24 ; 1.099,0.24 1.19,0.24 ; 1.099,0.71 1.099,1.19 ; 1.099,0.71 1.19,0.71 ; 1.099,1.19 1.19,1.19 ; 1.19,-1.19 1.19,-0.71 ; 1.19,-1.19 1.4,-1.19 1.4,-0.71 1.19,-0.71 ; 1.19,-0.24 1.4,-0.24 1.4,0.24 1.19,0.24 ; 1.19,-0.24 1.19,0.24 ; 1.19,0.71 1.19,1.19 ; 1.19,0.71 1.4,0.71 1.4,1.19 1.19,1.19
  text ".Designator" at 0.233,-1.719 h1
Top Text:
  lines w0.05: -2,-1.75 -2,1.75 2,1.75 2,-1.75 -2,-1.75
  lines w0.1: -0.5,0 0.5,0 ; 0,-0.5 0,0.5
3D body "SC-74-6.stp": height 1.14, standoff 0.04, extent -1.275,-1.45 1.325,1.45

## SOT23-8 [mm] "SOT23-8, 8-Leads, Body 2,90x1,63mm, Pitch 0,65mm, IPC Medium Density"
height 1
pads (8):
  rect 0.95x0.45 smd paste+0 mask+0.05: 1(-1.375,0.975)
  oval 0.95x0.45 smd paste+0 mask+0.05: 2(-1.375,0.325) 3(-1.375,-0.325) 4(-1.375,-0.975) 5(1.375,-0.975) 6(1.375,-0.325) 7(1.375,0.325) 8(1.375,0.975)
Top Overlay:
  circle w0.25: c-1.7,1.725 r0.125
  lines w0.2: -1,-1.575 -1,-1.7 1,-1.7 1,-1.575 ; -1,1.575 -1,1.7 1,1.7 1,1.575
Top Assy:
  drawing of 1365 lines, arcs and shapes, not listed
  text ".Designator" at 0.233,-1.719 h1
Top Text:
  lines w0.05: -2.075,-1.7 2.075,-1.7 2.075,1.7 -2.075,1.7 -2.075,-1.7
  lines w0.1: -0.5,0 0.5,0 ; 0,-0.5 0,0.5
3D body "SOT23-8.step": height 1.2, standoff 0, extent -1.4,-1.495 1.4,1.445

## SOT89-3 [mm] "SOT89, 3-Leads, Body 4.50x2.45mm, Pitch 1.50mm, Lead Span 4.1mm, IPC Medium Density"
height 1.5
pads (4):
  rect 1.4x0.6 smd paste+0 mask+0.05: 1(-1.8,1.5) 3(-1.8,-1.5)
  rect 1.8x0.6 smd paste+0 mask+0.05: 2(-1.6,0)
  oct 3.2x1.7 smd paste-10: 4(0.9,0)
Top Overlay:
  circle w0.25: c-1.925,2.35 r0.125
  lines w0.2: -1.275,-2.3 1.325,-2.3 1.325,-1.25 ; -1.275,2.3 1.325,2.3 1.325,1.25
Top Paste:
  rectangle: -0.25,0.3 0.25,0.8
  rectangle: -0.25,-0.3 0.25,0.2
  rectangle: -0.25,-0.8 0.25,-0.4
  rectangle: 0.35,-0.8 0.85,-0.4
  rectangle: 0.35,-0.3 0.85,0.2
  rectangle: 0.35,0.3 0.85,0.8
  rectangle: 0.95,-0.8 1.45,-0.4
  rectangle: 0.95,-0.3 1.45,0.2
  rectangle: 0.95,0.3 1.45,0.8
  rectangle: 1.55,-0.8 2.05,-0.4
  rectangle: 1.55,-0.3 2.05,0.2
  rectangle: 1.55,0.3 2.05,0.8
Top Assy:
  drawing of 476 lines, arcs and shapes, not listed
  text ".Designator" at 0.349,-2.579 h1.5
Top Text:
  lines w0.05: -2.75,-2.55 2.75,-2.55 2.75,2.55 -2.75,2.55 -2.75,-2.55
  lines w0.1: -0.475,0 0.525,0 ; 0.025,-0.5 0.025,0.5
3D body "SOT89-150P410X150-3N.step": height 1.5, standoff 0, extent -2.2,-2.296 1.85,2.297